# Altium schematic symbol library IC_ADI.SCHLIB: 3169 symbols (part 97 of 181)
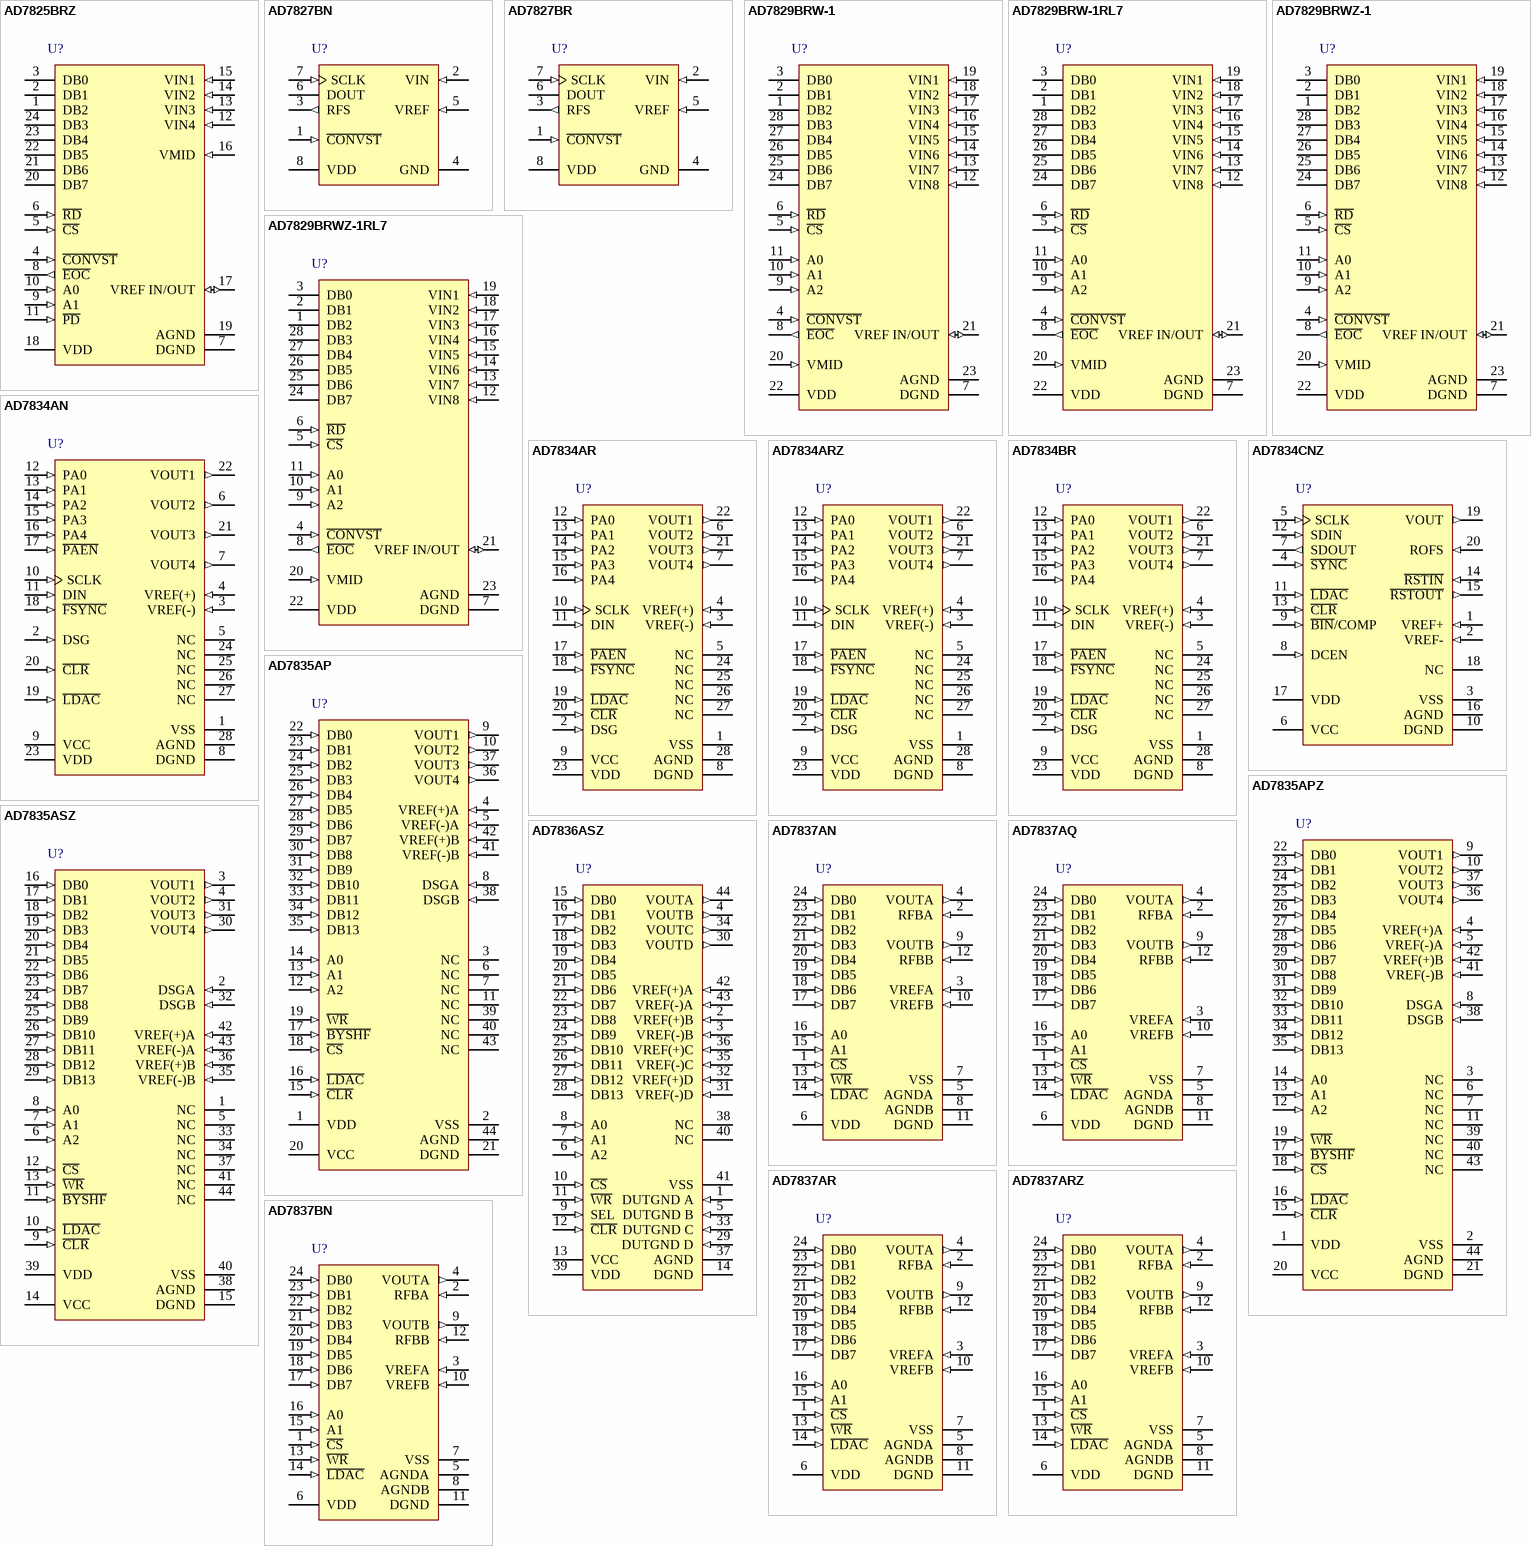
[diagram p287: symbols AD7825BRZ to AD7837BN]

## AD7829BRWZ-1
designator U?
Octal 8-Bit Analog-to-Digital Converter with Parallel Interface,3 V, 2MSPS, -40 to +85 degC, RW-28, Pb-Free, Tube; Generic Part Number: AD7829-1; PartNumber: AD7829BRWZ-1; Resolution (Bits): 8; Throughput Rate (SPS): 2M; Interface: Par; DatasheetVersion: Rev.0; PackageVersion: 060706-A; PackageReference: RW-28; PackageDescription: 28-Lead Standard Small Outline Package [SOIC_W]; Supplier Part Number 1: AD7829BRWZ-1-ND; Supplier Part Number 2: 1498673; Supplier Part Number 3: 28M4074; Supplier Part Number 4: 584-AD7829BRWZ-1; Channels: 8; RoHS: Y; Packing: Tube; Mounting Technology: Surface Mount; Code_JEDEC: MS-013-AE; ComponentLink1Description: Manufacturer URL; ComponentLink2Description: Datasheet; ComponentLink3Description: Package Specification; ComponentLink4Description: Product URL
footprint SOIC28W_1.27 (Footprint not found)
pins: 1 DB2 (hiz) "Data Output Lines. They are normally held in a high impedance state. Data is driven onto the data bus when both R\D\ and C\S\ go active low.", 2 DB1 (hiz) "Data Output Lines. They are normally held in a high impedance state. Data is driven onto the data bus when both R\D\ and C\S\ go active low.", 3 DB0 (hiz) "Data Output Lines. They are normally held in a high impedance state. Data is driven onto the data bus when both R\D\ and C\S\ go active low.", 4 ~{CONVST} (in) "Logic Input Signal. The convert start signal initiates an 8-bit analog-to-digital conversion on the falling edge of this signal. The falling edge of this signal places the track/hold in hold mode. The track/hold goes into (See Datasheet)", 5 ~{CS} (in) "Logic Input Signal. The chip select signal is used to enable the parallel port of the AD7829. This is necessary if the ADC is sharing a common data bus with another device.", 6 ~{RD} (in) "Logic Input Signal. The read signal is used to take the output buffers out of their high impedance state and drive data onto the data bus. The signal is internally gated with the CS signal. Both R\D\ and C\S\ must be logic (See Datasheet)", 7 DGND (power) "Digital Ground. Ground reference for digital circuitry.", 8 ~{EOC} (out) "Logic Output. The end of conversion signal indicates when a conversion has finished. The signal can be used to interrupt a microcontroller when a conversion has finished or latch data into a gate array (see the Parallel (See Datasheet)", 9 A2 (in) "Channel Address Inputs. The address of the next multiplexer channel must be present on these inputs when the R\D\ signal goes low.", 10 A1 (in) "Channel Address Inputs. The address of the next multiplexer channel must be present on these inputs when the R\D\ signal goes low.", 11 A0 (in) "Channel Address Inputs. The address of the next multiplexer channel must be present on these inputs when the R\D\ signal goes low.", 12 VIN8 (in) "Analog Input Channels. The AD7829-1 has eight analog input channels. The inputs have an input span of 2.5 V and 2 V, depending on the supply voltage (VDD). This span can be centered anywhere in the range AGND to VDD using (See Datasheet)", 13 VIN7 (in) "Analog Input Channels. The AD7829-1 has eight analog input channels. The inputs have an input span of 2.5 V and 2 V, depending on the supply voltage (VDD). This span can be centered anywhere in the range AGND to VDD using (See Datasheet)", 14 VIN6 (in) "Analog Input Channels. The AD7829-1 has eight analog input channels. The inputs have an input span of 2.5 V and 2 V, depending on the supply voltage (VDD). This span can be centered anywhere in the range AGND to VDD using (See Datasheet)", 15 VIN5 (in) "Analog Input Channels. The AD7829-1 has eight analog input channels. The inputs have an input span of 2.5 V and 2 V, depending on the supply voltage (VDD). This span can be centered anywhere in the range AGND to VDD using (See Datasheet)", 16 VIN4 (in) "Analog Input Channels. The AD7829-1 has eight analog input channels. The inputs have an input span of 2.5 V and 2 V, depending on the supply voltage (VDD). This span can be centered anywhere in the range AGND to VDD using (See Datasheet)", 17 VIN3 (in) "Analog Input Channels. The AD7829-1 has eight analog input channels. The inputs have an input span of 2.5 V and 2 V, depending on the supply voltage (VDD). This span can be centered anywhere in the range AGND to VDD using (See Datasheet)", 18 VIN2 (in) "Analog Input Channels. The AD7829-1 has eight analog input channels. The inputs have an input span of 2.5 V and 2 V, depending on the supply voltage (VDD). This span can be centered anywhere in the range AGND to VDD using (See Datasheet)", 19 VIN1 (in) "Analog Input Channels. The AD7829-1 has eight analog input channels. The inputs have an input span of 2.5 V and 2 V, depending on the supply voltage (VDD). This span can be centered anywhere in the range AGND to VDD using (See Datasheet)", 20 VMID (in) "The VMID pin, if connected, is used to center the analog input span anywhere in the range of AGND to VDD (see the Analog Input section).", 21 VREF IN/OUT (io) "Analog Input and Output. An external reference can be connected to the AD7829-1 at this pin. The on-chip reference is also available at this pin. When using the internal reference, this pin can be left unconnected or, in (See Datasheet)", 22 VDD (power) "Positive Supply Voltage, 3 V +/- 10% and 5 V +/- 10%.", 23 AGND (power) "Analog Ground. Ground reference for track/hold, comparators, reference circuit, and multiplexer.", 24 DB7 (hiz) "Data Output Lines. They are normally held in a high impedance state. Data is driven onto the data bus when both R\D\ and C\S\ go active low.", 25 DB6 (hiz) "Data Output Lines. They are normally held in a high impedance state. Data is driven onto the data bus when both R\D\ and C\S\ go active low.", 26 DB5 (hiz) "Data Output Lines. They are normally held in a high impedance state. Data is driven onto the data bus when both R\D\ and C\S\ go active low.", 27 DB4 (hiz) "Data Output Lines. They are normally held in a high impedance state. Data is driven onto the data bus when both R\D\ and C\S\ go active low.", 28 DB3 (hiz) "Data Output Lines. They are normally held in a high impedance state. Data is driven onto the data bus when both R\D\ and C\S\ go active low."

## AD7829BRWZ-1RL7
designator U?
Octal 8-Bit Analog-to-Digital Converter with Parallel Interface,3 V, 2MSPS, -40 to +85 degC, RW-28, Pb-Free, Reel; Generic Part Number: AD7829-1; PartNumber: AD7829BRWZ-1RL7; Resolution (Bits): 8; Throughput Rate (SPS): 2M; Interface: Par; DatasheetVersion: Rev.0; PackageVersion: 060706-A; PackageReference: RW-28; PackageDescription: 28-Lead Standard Small Outline Package [SOIC_W]; Supplier Part Number 1: AD7829BRWZ-1RL7-ND; Supplier Part Number 2: 584-AD7829BRWZ-1R7; Channels: 8; RoHS: Y; Packing: Reel; Mounting Technology: Surface Mount; Code_JEDEC: MS-013-AE; ComponentLink1Description: Manufacturer URL; ComponentLink2Description: Datasheet; ComponentLink3Description: Package Specification; ComponentLink4Description: Product URL
footprint SOIC28W_1.27 (Footprint not found)
pins: 1 DB2 (hiz) "Data Output Lines. They are normally held in a high impedance state. Data is driven onto the data bus when both R\D\ and C\S\ go active low.", 2 DB1 (hiz) "Data Output Lines. They are normally held in a high impedance state. Data is driven onto the data bus when both R\D\ and C\S\ go active low.", 3 DB0 (hiz) "Data Output Lines. They are normally held in a high impedance state. Data is driven onto the data bus when both R\D\ and C\S\ go active low.", 4 ~{CONVST} (in) "Logic Input Signal. The convert start signal initiates an 8-bit analog-to-digital conversion on the falling edge of this signal. The falling edge of this signal places the track/hold in hold mode. The track/hold goes into (See Datasheet)", 5 ~{CS} (in) "Logic Input Signal. The chip select signal is used to enable the parallel port of the AD7829. This is necessary if the ADC is sharing a common data bus with another device.", 6 ~{RD} (in) "Logic Input Signal. The read signal is used to take the output buffers out of their high impedance state and drive data onto the data bus. The signal is internally gated with the CS signal. Both R\D\ and C\S\ must be logic (See Datasheet)", 7 DGND (power) "Digital Ground. Ground reference for digital circuitry.", 8 ~{EOC} (out) "Logic Output. The end of conversion signal indicates when a conversion has finished. The signal can be used to interrupt a microcontroller when a conversion has finished or latch data into a gate array (see the Parallel (See Datasheet)", 9 A2 (in) "Channel Address Inputs. The address of the next multiplexer channel must be present on these inputs when the R\D\ signal goes low.", 10 A1 (in) "Channel Address Inputs. The address of the next multiplexer channel must be present on these inputs when the R\D\ signal goes low.", 11 A0 (in) "Channel Address Inputs. The address of the next multiplexer channel must be present on these inputs when the R\D\ signal goes low.", 12 VIN8 (in) "Analog Input Channels. The AD7829-1 has eight analog input channels. The inputs have an input span of 2.5 V and 2 V, depending on the supply voltage (VDD). This span can be centered anywhere in the range AGND to VDD using (See Datasheet)", 13 VIN7 (in) "Analog Input Channels. The AD7829-1 has eight analog input channels. The inputs have an input span of 2.5 V and 2 V, depending on the supply voltage (VDD). This span can be centered anywhere in the range AGND to VDD using (See Datasheet)", 14 VIN6 (in) "Analog Input Channels. The AD7829-1 has eight analog input channels. The inputs have an input span of 2.5 V and 2 V, depending on the supply voltage (VDD). This span can be centered anywhere in the range AGND to VDD using (See Datasheet)", 15 VIN5 (in) "Analog Input Channels. The AD7829-1 has eight analog input channels. The inputs have an input span of 2.5 V and 2 V, depending on the supply voltage (VDD). This span can be centered anywhere in the range AGND to VDD using (See Datasheet)", 16 VIN4 (in) "Analog Input Channels. The AD7829-1 has eight analog input channels. The inputs have an input span of 2.5 V and 2 V, depending on the supply voltage (VDD). This span can be centered anywhere in the range AGND to VDD using (See Datasheet)", 17 VIN3 (in) "Analog Input Channels. The AD7829-1 has eight analog input channels. The inputs have an input span of 2.5 V and 2 V, depending on the supply voltage (VDD). This span can be centered anywhere in the range AGND to VDD using (See Datasheet)", 18 VIN2 (in) "Analog Input Channels. The AD7829-1 has eight analog input channels. The inputs have an input span of 2.5 V and 2 V, depending on the supply voltage (VDD). This span can be centered anywhere in the range AGND to VDD using (See Datasheet)", 19 VIN1 (in) "Analog Input Channels. The AD7829-1 has eight analog input channels. The inputs have an input span of 2.5 V and 2 V, depending on the supply voltage (VDD). This span can be centered anywhere in the range AGND to VDD using (See Datasheet)", 20 VMID (in) "The VMID pin, if connected, is used to center the analog input span anywhere in the range of AGND to VDD (see the Analog Input section).", 21 VREF IN/OUT (io) "Analog Input and Output. An external reference can be connected to the AD7829-1 at this pin. The on-chip reference is also available at this pin. When using the internal reference, this pin can be left unconnected or, in (See Datasheet)", 22 VDD (power) "Positive Supply Voltage, 3 V +/- 10% and 5 V +/- 10%.", 23 AGND (power) "Analog Ground. Ground reference for track/hold, comparators, reference circuit, and multiplexer.", 24 DB7 (hiz) "Data Output Lines. They are normally held in a high impedance state. Data is driven onto the data bus when both R\D\ and C\S\ go active low.", 25 DB6 (hiz) "Data Output Lines. They are normally held in a high impedance state. Data is driven onto the data bus when both R\D\ and C\S\ go active low.", 26 DB5 (hiz) "Data Output Lines. They are normally held in a high impedance state. Data is driven onto the data bus when both R\D\ and C\S\ go active low.", 27 DB4 (hiz) "Data Output Lines. They are normally held in a high impedance state. Data is driven onto the data bus when both R\D\ and C\S\ go active low.", 28 DB3 (hiz) "Data Output Lines. They are normally held in a high impedance state. Data is driven onto the data bus when both R\D\ and C\S\ go active low."

## AD7834AN
designator U?
Quad 14-Bit LC2MOS Digital-to-Analog Converter, -40 to +85 degC, N-28-2, Tube; Generic Part Number: AD7834; PartNumber: AD7834AN; # DAC Outputs: 4; Max V+: 15.75V; Op Pwr Diss: 465mW; Resolution (Bits): 14; Settling Time: 10祍; Single Supply: No; DatasheetVersion: Rev.D; PackageVersion: 071006-A; PackageReference: N-28-2; PackageDescription: 28-Lead Plastic Dual In-Line Package [PDIP]; Supplier Part Number 1: AD7834AN-ND; Supplier Part Number 2: 584-AD7834AN; Packing: Tube; RoHS: N; Mounting Technology: Through Hole; Code_JEDEC: MS-011; ComponentLink1Description: Manufacturer URL; ComponentLink2Description: Datasheet; ComponentLink3Description: Package Specification; ComponentLink4Description: Product URL
footprint DIP28W
pins: 1 VSS (power) "Negative Analog Power Supply: -15 V +/- 5% or -12 V +/- 5%.", 2 DSG (in) "Device Sense Ground Input. Used in conjunction with the C\L\R\ input for power-on protection of  the DACs. When C\L\R\ is low, the DAC outputs are forced to the potential on the DSG pin.", 3 VREF(-) (in) "Negative Reference Input. The negative reference voltage is referred to AGND.", 4 VREF(+) (in) "Positive Reference Input. The positive reference voltage is referred to AGND.", 5 NC "No Connect.", 6 VOUT2 (out) "DAC Output.", 7 VOUT4 (out) "DAC Output.", 8 DGND (power) "Digital Ground.", 9 VCC (power) "Logic Power Supply: 5 V +/- 5%.", 10 SCLK (in) "Clock Input. Used for writing data to the device; data is clocked into the input register on the falling edge of SCLK.", 11 DIN (in) "Serial Data Input.", 12 PA0 (in) "Package Address Input. These inputs are hardwired high (VCC) or low (DGND) to assign dedicated package addresses in a multipackage environment.", 13 PA1 (in) "Package Address Input. These inputs are hardwired high (VCC) or low (DGND) to assign dedicated package addresses in a multipackage environment.", 14 PA2 (in) "Package Address Input. These inputs are hardwired high (VCC) or low (DGND) to assign dedicated package addresses in a multipackage environment.", 15 PA3 (in) "Package Address Input. These inputs are hardwired high (VCC) or low (DGND) to assign dedicated package addresses in a multipackage environment.", 16 PA4 (in) "Package Address Input. These inputs are hardwired high (VCC) or low (DGND) to assign dedicated package addresses in a multipackage environment.", 17 ~{PAEN} (in) "Package Address Enable Input. When low, this input allows normal operation of the device. When high, the device ignores the package address, but not the channel address, in the serial data stream and loads the serial data (See Datasheet)", 18 ~{FSYNC} (in) "Frame Sync Input. Active low logic input used, in conjunction with DIN and SCLK, to write data to the device with serial data expected after the falling edge of this signal. The contents of the 24-bit serial-to-parallel (See Datasheet)", 19 ~{LDAC} (in) "Load DAC Input (Level Sensitive). This input signal, in conjunction with the F\S\Y\N\C\ input signal, determines how the analog outputs are updated. If L\D\A\C\ is maintained high while new data is being loaded into the (See Datasheet)", 20 ~{CLR} (in) "Asynchronous Clear Input (Level Sensitive, Active Low). When this input is brought low, all analog outputs are switched to the externally set potential on the DSG pin. When C\L\R\ is brought high, the signal outputs remain (See Datasheet)", 21 VOUT3 (out) "DAC Output.", 22 VOUT1 (out) "DAC Output.", 23 VDD (power) "Positive Analog Power Supply: 15 V +/-5% or 12 V +/- 5%.", 24 NC "No Connect.", 25 NC "No Connect.", 26 NC "No Connect.", 27 NC "No Connect.", 28 AGND (power) "Analog Ground."

## AD7834AR
designator U?
Quad 14-Bit LC2MOS Digital-to-Analog Converter, -40 to +85 degC, RW-28, Tube; Generic Part Number: AD7834; PartNumber: AD7834AR; # DAC Outputs: 4; Max V+: 15.75V; Op Pwr Diss: 465mW; Resolution (Bits): 14; Settling Time: 10祍; Single Supply: No; DatasheetVersion: Rev.D; PackageVersion: 060706-A; PackageReference: RW-28; PackageDescription: 28-Lead Standard Small Outline Package [SOIC_W]; Supplier Part Number 1: AD7834AR-ND; Supplier Part Number 2: 584-AD7834AR; Packing: Tube; RoHS: N; Mounting Technology: Surface Mount; Code_JEDEC: MS-013-AE; ComponentLink1Description: Manufacturer URL; ComponentLink2Description: Datasheet; ComponentLink3Description: Product URL
footprint SOIC28W_1.27 (Footprint not found)
pins: 1 VSS (power) "Negative Analog Power Supply: -15 V +/- 5% or -12 V +/- 5%.", 2 DSG (in) "Device Sense Ground Input. Used in conjunction with the C\L\R\ input for power-on protection of  the DACs. When C\L\R\ is low, the DAC outputs are forced to the potential on the DSG pin.", 3 VREF(-) (in) "Negative Reference Input. The negative reference voltage is referred to AGND.", 4 VREF(+) (in) "Positive Reference Input. The positive reference voltage is referred to AGND.", 5 NC "No Connect.", 6 VOUT2 (out) "DAC Output.", 7 VOUT4 (out) "DAC Output.", 8 DGND (power) "Digital Ground.", 9 VCC (power) "Logic Power Supply: 5 V +/- 5%.", 10 SCLK (in) "Clock Input. Used for writing data to the device; data is clocked into the input register on the falling edge of SCLK.", 11 DIN (in) "Serial Data Input.", 12 PA0 (in) "Package Address Input. These inputs are hardwired high (VCC) or low (DGND) to assign dedicated package addresses in a multipackage environment.", 13 PA1 (in) "Package Address Input. These inputs are hardwired high (VCC) or low (DGND) to assign dedicated package addresses in a multipackage environment.", 14 PA2 (in) "Package Address Input. These inputs are hardwired high (VCC) or low (DGND) to assign dedicated package addresses in a multipackage environment.", 15 PA3 (in) "Package Address Input. These inputs are hardwired high (VCC) or low (DGND) to assign dedicated package addresses in a multipackage environment.", 16 PA4 (in) "Package Address Input. These inputs are hardwired high (VCC) or low (DGND) to assign dedicated package addresses in a multipackage environment.", 17 ~{PAEN} (in) "Package Address Enable Input. When low, this input allows normal operation of the device. When high, the device ignores the package address, but not the channel address, in the serial data stream and loads the serial data (See Datasheet)", 18 ~{FSYNC} (in) "Frame Sync Input. Active low logic input used, in conjunction with DIN and SCLK, to write data to the device with serial data expected after the falling edge of this signal. The contents of the 24-bit serial-to-parallel (See Datasheet)", 19 ~{LDAC} (in) "Load DAC Input (Level Sensitive). This input signal, in conjunction with the F\S\Y\N\C\ input signal, determines how the analog outputs are updated. If L\D\A\C\ is maintained high while new data is being loaded into the (See Datasheet)", 20 ~{CLR} (in) "Asynchronous Clear Input (Level Sensitive, Active Low). When this input is brought low, all analog outputs are switched to the externally set potential on the DSG pin. When C\L\R\ is brought high, the signal outputs remain (See Datasheet)", 21 VOUT3 (out) "DAC Output.", 22 VOUT1 (out) "DAC Output.", 23 VDD (power) "Positive Analog Power Supply: 15 V +/- 5% or 12 V +/- 5%.", 24 NC "No Connect.", 25 NC "No Connect.", 26 NC "No Connect.", 27 NC "No Connect.", 28 AGND (power) "Analog Ground."

## AD7834ARZ
designator U?
Quad 14-Bit LC2MOS Digital-to-Analog Converter, -40 to +85 degC, RW-28, Pb-Free, Tube; Generic Part Number: AD7834; PartNumber: AD7834ARZ; # DAC Outputs: 4; Max V+: 15.75V; Op Pwr Diss: 465mW; Resolution (Bits): 14; Settling Time: 10祍; Single Supply: No; DatasheetVersion: Rev.D; PackageVersion: 060706-A; PackageReference: RW-28; PackageDescription: 28-Lead Standard Small Outline Package [SOIC_W]; Supplier Part Number 1: AD7834ARZ-ND; Supplier Part Number 2: 584-AD7834ARZ; Packing: Tube; RoHS: Y; Mounting Technology: Surface Mount; Code_JEDEC: MS-013-AE; ComponentLink1Description: Manufacturer URL; ComponentLink2Description: Datasheet; ComponentLink3Description: Product URL
footprint SOIC28W_1.27 (Footprint not found)
pins: 1 VSS (power) "Negative Analog Power Supply: -15 V +/- 5% or -12 V +/- 5%.", 2 DSG (in) "Device Sense Ground Input. Used in conjunction with the C\L\R\ input for power-on protection of  the DACs. When C\L\R\ is low, the DAC outputs are forced to the potential on the DSG pin.", 3 VREF(-) (in) "Negative Reference Input. The negative reference voltage is referred to AGND.", 4 VREF(+) (in) "Positive Reference Input. The positive reference voltage is referred to AGND.", 5 NC "No Connect.", 6 VOUT2 (out) "DAC Output.", 7 VOUT4 (out) "DAC Output.", 8 DGND (power) "Digital Ground.", 9 VCC (power) "Logic Power Supply: 5 V +/- 5%.", 10 SCLK (in) "Clock Input. Used for writing data to the device; data is clocked into the input register on the falling edge of SCLK.", 11 DIN (in) "Serial Data Input.", 12 PA0 (in) "Package Address Input. These inputs are hardwired high (VCC) or low (DGND) to assign dedicated package addresses in a multipackage environment.", 13 PA1 (in) "Package Address Input. These inputs are hardwired high (VCC) or low (DGND) to assign dedicated package addresses in a multipackage environment.", 14 PA2 (in) "Package Address Input. These inputs are hardwired high (VCC) or low (DGND) to assign dedicated package addresses in a multipackage environment.", 15 PA3 (in) "Package Address Input. These inputs are hardwired high (VCC) or low (DGND) to assign dedicated package addresses in a multipackage environment.", 16 PA4 (in) "Package Address Input. These inputs are hardwired high (VCC) or low (DGND) to assign dedicated package addresses in a multipackage environment.", 17 ~{PAEN} (in) "Package Address Enable Input. When low, this input allows normal operation of the device. When high, the device ignores the package address, but not the channel address, in the serial data stream and loads the serial data (See Datasheet)", 18 ~{FSYNC} (in) "Frame Sync Input. Active low logic input used, in conjunction with DIN and SCLK, to write data to the device with serial data expected after the falling edge of this signal. The contents of the 24-bit serial-to-parallel (See Datasheet)", 19 ~{LDAC} (in) "Load DAC Input (Level Sensitive). This input signal, in conjunction with the F\S\Y\N\C\ input signal, determines how the analog outputs are updated. If L\D\A\C\ is maintained high while new data is being loaded into the (See Datasheet)", 20 ~{CLR} (in) "Asynchronous Clear Input (Level Sensitive, Active Low). When this input is brought low, all analog outputs are switched to the externally set potential on the DSG pin. When C\L\R\ is brought high, the signal outputs remain (See Datasheet)", 21 VOUT3 (out) "DAC Output.", 22 VOUT1 (out) "DAC Output.", 23 VDD (power) "Positive Analog Power Supply: 15 V +/- 5% or 12 V +/- 5%.", 24 NC "No Connect.", 25 NC "No Connect.", 26 NC "No Connect.", 27 NC "No Connect.", 28 AGND (power) "Analog Ground."

## AD7834BR
designator U?
Quad 14-Bit LC2MOS Digital-to-Analog Converter, -40 to +85 degC, RW-28, Tube; Generic Part Number: AD7834; PartNumber: AD7834BR; # DAC Outputs: 4; Max V+: 15.75V; Op Pwr Diss: 465mW; Resolution (Bits): 14; Settling Time: 10祍; Single Supply: No; DatasheetVersion: Rev.D; PackageVersion: 060706-A; PackageReference: RW-28; PackageDescription: 28-Lead Standard Small Outline Package [SOIC_W]; Supplier Part Number 1: AD7834BR-ND; Supplier Part Number 2: 584-AD7834BR; Packing: Tube; RoHS: N; Mounting Technology: Surface Mount; Code_JEDEC: MS-013-AE; ComponentLink1Description: Manufacturer URL; ComponentLink2Description: Datasheet; ComponentLink3Description: Product URL
footprint SOIC28W_1.27 (Footprint not found)
pins: 1 VSS (power) "Negative Analog Power Supply: -15 V +/- 5% or -12 V +/- 5%.", 2 DSG (in) "Device Sense Ground Input. Used in conjunction with the C\L\R\ input for power-on protection of  the DACs. When C\L\R\ is low, the DAC outputs are forced to the potential on the DSG pin.", 3 VREF(-) (in) "Negative Reference Input. The negative reference voltage is referred to AGND.", 4 VREF(+) (in) "Positive Reference Input. The positive reference voltage is referred to AGND.", 5 NC "No Connect.", 6 VOUT2 (out) "DAC Output.", 7 VOUT4 (out) "DAC Output.", 8 DGND (power) "Digital Ground.", 9 VCC (power) "Logic Power Supply: 5 V +/- 5%.", 10 SCLK (in) "Clock Input. Used for writing data to the device; data is clocked into the input register on the falling edge of SCLK.", 11 DIN (in) "Serial Data Input.", 12 PA0 (in) "Package Address Input. These inputs are hardwired high (VCC) or low (DGND) to assign dedicated package addresses in a multipackage environment.", 13 PA1 (in) "Package Address Input. These inputs are hardwired high (VCC) or low (DGND) to assign dedicated package addresses in a multipackage environment.", 14 PA2 (in) "Package Address Input. These inputs are hardwired high (VCC) or low (DGND) to assign dedicated package addresses in a multipackage environment.", 15 PA3 (in) "Package Address Input. These inputs are hardwired high (VCC) or low (DGND) to assign dedicated package addresses in a multipackage environment.", 16 PA4 (in) "Package Address Input. These inputs are hardwired high (VCC) or low (DGND) to assign dedicated package addresses in a multipackage environment.", 17 ~{PAEN} (in) "Package Address Enable Input. When low, this input allows normal operation of the device. When high, the device ignores the package address, but not the channel address, in the serial data stream and loads the serial data (See Datasheet)", 18 ~{FSYNC} (in) "Frame Sync Input. Active low logic input used, in conjunction with DIN and SCLK, to write data to the device with serial data expected after the falling edge of this signal. The contents of the 24-bit serial-to-parallel (See Datasheet)", 19 ~{LDAC} (in) "Load DAC Input (Level Sensitive). This input signal, in conjunction with the F\S\Y\N\C\ input signal, determines how the analog outputs are updated. If L\D\A\C\ is maintained high while new data is being loaded into the (See Datasheet)", 20 ~{CLR} (in) "Asynchronous Clear Input (Level Sensitive, Active Low). When this input is brought low, all analog outputs are switched to the externally set potential on the DSG pin. When C\L\R\ is brought high, the signal outputs remain (See Datasheet)", 21 VOUT3 (out) "DAC Output.", 22 VOUT1 (out) "DAC Output.", 23 VDD (power) "Positive Analog Power Supply: 15 V +/- 5% or 12 V +/- 5%.", 24 NC "No Connect.", 25 NC "No Connect.", 26 NC "No Connect.", 27 NC "No Connect.", 28 AGND (power) "Analog Ground."

## AD7834CNZ
designator U?
Single 16-Bit Digital-to-Analog Converter with Serial Interface, -40 to +85 degC, N-20, Pb-Free, Tube; Generic Part Number: AD7849; PartNumber: AD7834CNZ; # DAC Outputs: 1; Max V+: 15.75V; Op Pwr Diss: 163mW; Resolution (Bits): 16; Settling Time: 7祍; Single Supply: No; DatasheetVersion: Rev.C; PackageVersion: 070706-A; PackageReference: N-20; PackageDescription: 20-Lead Plastic Dual In-Line Package [PDIP] Narrow Body; Supplier Part Number 1: N/A; Packing: Tube; RoHS: Y; Mounting Technology: Through Hole; Code_JEDEC: MS-001; ComponentLink1Description: Manufacturer URL; ComponentLink2Description: Datasheet; ComponentLink3Description: Package Specification; ComponentLink4Description: Product URL
footprint DIP20 (Footprint not found)
pins: 1 VREF+ (in) "VREF+ Input. The DAC is specified for VREF+ of 5 V. The DAC is fully multiplying so that the VREF+ range is +5 V to -5 V.", 2 VREF- (in) "VREF? Input. The DAC is specified for VREF- of -5 V. The DAC is fully multiplying so that the VREF- range is -5 V to +5 V.", 3 VSS (power) "Negative supply for the analog circuitry. This is nominally -15 V.", 4 ~{SYNC} (in) "Data Synchronization Logic Input. When it goes low, the internal logic is initialized in readiness for a new data-word.", 5 SCLK (in) "Serial Clock Logic Input. Data is clocked into the input register on each SCLK falling edge.", 6 VCC (power) "Positive supply for the digital circuitry. This is nominally 5 V.", 7 SDOUT (out) "Serial Data Output. With DCEN at Logic 1, this output is enabled, and the serial data in the input shift register is clocked out on each rising edge of SCLK.", 8 DCEN (in) "Daisy-Chain Enable Logic Input. Connect this pin high if a daisy-chain interface is being used; otherwise, this pin must be connected low.", 9 ~{BIN}/COMP (in) "Logic Input. This input selects the data format to be either binary or twos complement. In the unipolar output range, natural binary format is selected by connecting the input to Logic 0. In the bipolar output range, offset (See Datasheet)", 10 DGND (power) "Digital Ground. Ground reference point for the on-chip digital circuitry.", 11 ~{LDAC} (in) "Load DAC Logic Input. This input updates the DAC output. The DAC output is updated on the falling edge of this signal, or alternatively, if this input is permanently low, an automatic update mode is selected where the DAC is (See Datasheet)", 12 SDIN (in) "Serial Data Input. The 16-bit serial data-word is applied to this input.", 13 ~{CLR} (in) "Clear Logic Input. Taking this input low sets VOUT to 0 V in both the unipolar output range and the bipolar twos complement output range. It sets VOUT to VREF- in the offset binary bipolar output range.", 14 ~{RSTIN} (in) "Reset Logic Input. This input allows external access to the internal reset logic. Applying Logic 0 to this input,resets the DAC output to 0 V. In normal operation, it should be tied to Logic 1.", 15 ~{RSTOUT} (out) "Reset Logic Output. This is the output from the on-chip voltage monitor used in the reset circuit. It can be used to control other system components, if desired", 16 AGND (power) "This is the analog ground for the device. It is the point to which the output gets shorted in reset mode.", 17 VDD (power) "Positive Supply for the Analog Circuitry. This is 15 V nominal.", 18 NC "No Connect. Leave unconnected.", 19 VOUT (out) "DAC Output Voltage Pin.", 20 ROFS (in) "Input to Summing Resistor of DAC Output Amplifier. This is used to select the output voltage ranges. Also, see Figure 20 to Figure 23 in the Applying the AD7849 section."

## AD7835AP
designator U?
Quad 14-Bit LC2MOS Digital-to-Analog Converter, -40 to +85 degC, P-44A, Tube; Generic Part Number: AD7835; PartNumber: AD7835AP; # DAC Outputs: 4; Max V+: 15.75V; Op Pwr Diss: 465mW; Resolution (Bits): 14; Settling Time: 10祍; Single Supply: No; DatasheetVersion: Rev.D; PackageVersion: 2003; PackageReference: P-44A; PackageDescription: 44-Lead Plastic Leaded Chip Carrier [PLCC]; Supplier Part Number 1: AD7835AP-ND; Supplier Part Number 2: 584-AD7835AP; Packing: Tube; RoHS: N; Mounting Technology: Surface Mount; Code_JEDEC: MO-047-AC; Code_IPC: PLCC-44; ComponentLink1Description: Manufacturer URL; ComponentLink2Description: Datasheet; ComponentLink3Description: Package Specification; ComponentLink4Description: Product URL
footprint PLCC-44N (Footprint not found)
pins: 1 VDD (power) "Positive Analog Power Supply: 15 V +/- 5% or 12 V +/- 5%.", 2 VSS (power) "Negative Analog Power Supply: -15 V +/- 5% or -12 V +/- 5%.", 3 NC "No Connect.", 4 VREF(+)A (in) "Reference Input for DAC 1 and DAC 2. These reference voltages are referred to AGND.", 5 VREF(-)A (in) "Reference Input for DAC 1 and DAC 2. These reference voltages are referred to AGND.", 6 NC "No Connect.", 7 NC "No Connect.", 8 DSGA (in) "Device Sense Ground A Input. Used in conjunction with the C\L\R\ input for power-on protection of the DACs. When C\L\R\ is low, DAC outputs VOUT1 and VOUT2 are forced to the potential on the DSGA pin.", 9 VOUT1 (out) "DAC Output.", 10 VOUT2 (out) "DAC Output.", 11 NC "No Connect.", 12 A2 (in) "Address Input. A0 and A1 are decoded to select one of the four input latches for a data transfer. A2 is used to select all four DACs simultaneously.", 13 A1 (in) "Address Input. A0 and A1 are decoded to select one of the four input latches for a data transfer. A2 is used to select all four DACs simultaneously.", 14 A0 (in) "Address Input. A0 and A1 are decoded to select one of the four input latches for a data transfer. A2 is used to select all four DACs simultaneously.", 15 ~{CLR} (in) "Asynchronous Clear Input (Level Sensitive, Active Low). When this input is brought low, all analog outputs are switched to the externally set potentials on the DSG pins (VOUT1 and VOUT2 follow DSGA, and VOUT3 and VOUT4 (See Datasheet)", 16 ~{LDAC} (in) "Load DAC Input (Level Sensitive). This input signal, in conjunction with the W\R\ and C\S\ input signals, determines how the analog outputs are updated. If L\D\A\C\ is maintained high while new data is being loaded into the (See Datasheet)", 17 ~{BYSHF} (in) "Byte Shift Input. When low, it shifts the data on DB0 to DB7 into the DB8 to DB13 half of the input register.", 18 ~{CS} (in) "Level-Triggered Chip Select Input (Active Low). The device is selected when this input is low.", 19 ~{WR} (in) "Level-Triggered Write Input (Active Low). When active, it is used in conjunction with C\S\ to write data over the input databus.", 20 VCC (power) "Logic Power Supply: 5 V +/- 5%.", 21 DGND (power) "Digital Ground.", 22 DB0 (in) "Parallel Data Input.", 23 DB1 (in) "Parallel Data Input.", 24 DB2 (in) "Parallel Data Input.", 25 DB3 (in) "Parallel Data Input.", 26 DB4 (in) "Parallel Data Input.", 27 DB5 (in) "Parallel Data Input.", 28 DB6 (in) "Parallel Data Input.", 29 DB7 (in) "Parallel Data Input.", 30 DB8 (in) "Parallel Data Input.", 31 DB9 (in) "Parallel Data Input.", 32 DB10 (in) "Parallel Data Input.", 33 DB11 (in) "Parallel Data Input.", 34 DB12 (in) "Parallel Data Input.", 35 DB13 (in) "Parallel Data Input.", 36 VOUT4 (out) "DAC Output.", 37 VOUT3 (out) "DAC Output.", 38 DSGB (in) "Device Sense Ground B Input. Used in conjunction with the C\L\R\ input for power-on protection of the DACs. When C\L\R\ is low, DAC outputs VOUT3 and VOUT4 are forced to the potential on the DSGB pin.", 39 NC "No Connect.", 40 NC "No Connect.", 41 VREF(-)B (in) "Reference Inputs for DACs 3 and 4. These reference voltages are referred to AGND.", 42 VREF(+)B (in) "Reference Inputs for DACs 3 and 4. These reference voltages are referred to AGND.", 43 NC "No Connect.", 44 AGND (power) "Analog Ground."

## AD7835APZ
designator U?
Quad 14-Bit LC2MOS Digital-to-Analog Converter, -40 to +85 degC, P-44A, Pb-Free, Tube; Generic Part Number: AD7835; PartNumber: AD7835APZ; # DAC Outputs: 4; Max V+: 15.75V; Op Pwr Diss: 465mW; Resolution (Bits): 14; Settling Time: 10祍; Single Supply: No; DatasheetVersion: Rev.D; PackageVersion: 2003; PackageReference: P-44A; PackageDescription: 44-Lead Plastic Leaded Chip Carrier [PLCC]; Supplier Part Number 1: AD7835APZ-ND; Supplier Part Number 2: 584-AD7835APZ; Packing: Tube; RoHS: Y; Mounting Technology: Surface Mount; Code_JEDEC: MO-047-AC; Code_IPC: PLCC-44; ComponentLink1Description: Manufacturer URL; ComponentLink2Description: Datasheet; ComponentLink3Description: Package Specification; ComponentLink4Description: Product URL
footprint PLCC-44N (Footprint not found)
pins: 1 VDD (power) "Positive Analog Power Supply: 15 V +/- 5% or 12 V +/- 5%.", 2 VSS (power) "Negative Analog Power Supply: -15 V +/- 5% or -12 V +/- 5%.", 3 NC "No Connect.", 4 VREF(+)A (in) "Reference Input for DAC 1 and DAC 2. These reference voltages are referred to AGND.", 5 VREF(-)A (in) "Reference Input for DAC 1 and DAC 2. These reference voltages are referred to AGND.", 6 NC "No Connect.", 7 NC "No Connect.", 8 DSGA (in) "Device Sense Ground A Input. Used in conjunction with the C\L\R\ input for power-on protection of the DACs. When C\L\R\ is low, DAC outputs VOUT1 and VOUT2 are forced to the potential on the DSGA pin.", 9 VOUT1 (out) "DAC Output.", 10 VOUT2 (out) "DAC Output.", 11 NC "No Connect.", 12 A2 (in) "Address Input. A0 and A1 are decoded to select one of the four input latches for a data transfer. A2 is used to select all four DACs simultaneously.", 13 A1 (in) "Address Input. A0 and A1 are decoded to select one of the four input latches for a data transfer. A2 is used to select all four DACs simultaneously.", 14 A0 (in) "Address Input. A0 and A1 are decoded to select one of the four input latches for a data transfer. A2 is used to select all four DACs simultaneously.", 15 ~{CLR} (in) "Asynchronous Clear Input (Level Sensitive, Active Low). When this input is brought low, all analog outputs are switched to the externally set potentials on the DSG pins (VOUT1 and VOUT2 follow DSGA, and VOUT3 and VOUT4 (See Datasheet)", 16 ~{LDAC} (in) "Load DAC Input (Level Sensitive). This input signal, in conjunction with the W\R\ and C\S\ input signals, determines how the analog outputs are updated. If L\D\A\C\ is maintained high while new data is being loaded into the (See Datasheet)", 17 ~{BYSHF} (in) "Byte Shift Input. When low, it shifts the data on DB0 to DB7 into the DB8 to DB13 half of the input register.", 18 ~{CS} (in) "Level-Triggered Chip Select Input (Active Low). The device is selected when this input is low.", 19 ~{WR} (in) "Level-Triggered Write Input (Active Low). When active, it is used in conjunction with C\S\ to write data over the input databus.", 20 VCC (power) "Logic Power Supply: 5 V +/- 5%.", 21 DGND (power) "Digital Ground.", 22 DB0 (in) "Parallel Data Input.", 23 DB1 (in) "Parallel Data Input.", 24 DB2 (in) "Parallel Data Input.", 25 DB3 (in) "Parallel Data Input.", 26 DB4 (in) "Parallel Data Input.", 27 DB5 (in) "Parallel Data Input.", 28 DB6 (in) "Parallel Data Input.", 29 DB7 (in) "Parallel Data Input.", 30 DB8 (in) "Parallel Data Input.", 31 DB9 (in) "Parallel Data Input.", 32 DB10 (in) "Parallel Data Input.", 33 DB11 (in) "Parallel Data Input.", 34 DB12 (in) "Parallel Data Input.", 35 DB13 (in) "Parallel Data Input.", 36 VOUT4 (out) "DAC Output.", 37 VOUT3 (out) "DAC Output.", 38 DSGB (in) "Device Sense Ground B Input. Used in conjunction with the C\L\R\ input for power-on protection of the DACs. When C\L\R\ is low, DAC outputs VOUT3 and VOUT4 are forced to the potential on the DSGB pin.", 39 NC "No Connect.", 40 NC "No Connect.", 41 VREF(-)B (in) "Reference Inputs for DACs 3 and 4. These reference voltages are referred to AGND.", 42 VREF(+)B (in) "Reference Inputs for DACs 3 and 4. These reference voltages are referred to AGND.", 43 NC "No Connect.", 44 AGND (power) "Analog Ground."

## AD7835ASZ
designator U?
Quad 14-Bit LC2MOS Digital-to-Analog Converter, 0 to +70 degC, S-44-2, Pb-Free, Tray; Generic Part Number: AD7835; PartNumber: AD7835ASZ; # DAC Outputs: 4; Max V+: 15.75V; Op Pwr Diss: 465mW; Resolution (Bits): 14; Settling Time: 10祍; Single Supply: No; DatasheetVersion: Rev.D; PackageVersion: 041807-A; PackageReference: S-44-2; PackageDescription: 44-Lead Metric Quad Flat Package [MQFP]; Supplier Part Number 1: AD7835ASZ-ND; Supplier Part Number 2: 59K5624; Supplier Part Number 3: 584-AD7835ASZ; Packing: Tray; RoHS: Y; Mounting Technology: Surface Mount; Code_JEDEC: MO-122-AA-1; ComponentLink1Description: Manufacturer URL; ComponentLink2Description: Datasheet; ComponentLink3Description: Package Specification; ComponentLink4Description: Product URL
footprint LQFP44_0.8mm (Footprint not found)
pins: 1 NC "No Connect.", 2 DSGA (in) "Device Sense Ground A Input. Used in conjunction with the C\L\R\ input for power-on protection of the DACs. When C\L\R\ is low, DAC outputs VOUT1 and VOUT2 are forced to the potential on the DSGA pin.", 3 VOUT1 (out) "DAC Output.", 4 VOUT2 (out) "DAC Output.", 5 NC "No Connect.", 6 A2 (in) "Address Input. A2 is used to select all four DACs simultaneously.", 7 A1 (in) "Address Input. A1 is decoded to select one of the four input latches for a data transfer.", 8 A0 (in) "Address Input. A0 is decoded to select one of the four input latches for a data transfer.", 9 ~{CLR} (in) "Asynchronous Clear Input (Level Sensitive, Active Low). When this input is brought low, all analog outputs are switched to the externally set potentials on the DSG pins (VOUT1 and VOUT2 follow DSGA, and VOUT3 and VOUT4 (See Datasheet)", 10 ~{LDAC} (in) "Load DAC Input (Level Sensitive). This input signal, in conjunction with the W\R\ and C\S\ input signals, determines how the analog outputs are updated. If L\D\A\C\ is maintained high while new data is being loaded into the (See Datasheet)", 11 ~{BYSHF} (in) "Byte Shift Input. When low, it shifts the data on DB0 to DB7 into the DB8 to DB13 half of the input register.", 12 ~{CS} (in) "Level-Triggered Chip Select Input (Active Low). The device is selected when this input is low.", 13 ~{WR} (in) "Level-Triggered Write Input (Active Low). When active, it is used in conjunction with C\S\ to write data over the input databus.", 14 VCC (power) "Logic Power Supply: 5 V +/- 5%.", 15 DGND (power) "Digital Ground.", 16 DB0 (in) "Parallel Data Input. The AD7835 can accept a straight 14-bit parallel word on DB0 to DB13, where DB13 is the MSB and the B\Y\S\H\F\ input is hardwired to a logic high. Alternatively for byte loading, the bottom eight data (See Datasheet)", 17 DB1 (in) "Parallel Data Input. The AD7835 can accept a straight 14-bit parallel word on DB0 to DB13, where DB13 is the MSB and the B\Y\S\H\F\ input is hardwired to a logic high. Alternatively for byte loading, the bottom eight data (See Datasheet)", 18 DB2 (in) "Parallel Data Input. The AD7835 can accept a straight 14-bit parallel word on DB0 to DB13, where DB13 is the MSB and the B\Y\S\H\F\ input is hardwired to a logic high. Alternatively for byte loading, the bottom eight data (See Datasheet)", 19 DB3 (in) "Parallel Data Input. The AD7835 can accept a straight 14-bit parallel word on DB0 to DB13, where DB13 is the MSB and the B\Y\S\H\F\ input is hardwired to a logic high. Alternatively for byte loading, the bottom eight data (See Datasheet)", 20 DB4 (in) "Parallel Data Input. The AD7835 can accept a straight 14-bit parallel word on DB0 to DB13, where DB13 is the MSB and the B\Y\S\H\F\ input is hardwired to a logic high. Alternatively for byte loading, the bottom eight data (See Datasheet)", 21 DB5 (in) "Parallel Data Input. The AD7835 can accept a straight 14-bit parallel word on DB0 to DB13, where DB13 is the MSB and the B\Y\S\H\F\ input is hardwired to a logic high. Alternatively for byte loading, the bottom eight data (See Datasheet)", 22 DB6 (in) "Parallel Data Input. The AD7835 can accept a straight 14-bit parallel word on DB0 to DB13, where DB13 is the MSB and the B\Y\S\H\F\ input is hardwired to a logic high. Alternatively for byte loading, the bottom eight data (See Datasheet)", 23 DB7 (in) "Parallel Data Input. The AD7835 can accept a straight 14-bit parallel word on DB0 to DB13, where DB13 is the MSB and the B\Y\S\H\F\ input is hardwired to a logic high. Alternatively for byte loading, the bottom eight data (See Datasheet)", 24 DB8 (in) "Parallel Data Input. The AD7835 can accept a straight 14-bit parallel word on DB0 to DB13, where DB13 is the MSB and the B\Y\S\H\F\ input is hardwired to a logic high. Alternatively for byte loading, the bottom eight data (See Datasheet)", 25 DB9 (in) "Parallel Data Input. The AD7835 can accept a straight 14-bit parallel word on DB0 to DB13, where DB13 is the MSB and the B\Y\S\H\F\ input is hardwired to a logic high. Alternatively for byte loading, the bottom eight data (See Datasheet)", 26 DB10 (in) "Parallel Data Input. The AD7835 can accept a straight 14-bit parallel word on DB0 to DB13, where DB13 is the MSB and the B\Y\S\H\F\ input is hardwired to a logic high. Alternatively for byte loading, the bottom eight data (See Datasheet)", 27 DB11 (in) "Parallel Data Input. The AD7835 can accept a straight 14-bit parallel word on DB0 to DB13, where DB13 is the MSB and the B\Y\S\H\F\ input is hardwired to a logic high. Alternatively for byte loading, the bottom eight data (See Datasheet)", 28 DB12 (in) "Parallel Data Input. The AD7835 can accept a straight 14-bit parallel word on DB0 to DB13, where DB13 is the MSB and the B\Y\S\H\F\ input is hardwired to a logic high. Alternatively for byte loading, the bottom eight data (See Datasheet)", 29 DB13 (in) "Parallel Data Input. The AD7835 can accept a straight 14-bit parallel word on DB0 to DB13, where DB13 is the MSB and the B\Y\S\H\F\ input is hardwired to a logic high. Alternatively for byte loading, the bottom eight data (See Datasheet)", 30 VOUT4 (out) "DAC Output.", 31 VOUT3 (out) "DAC Output.", 32 DSGB (in) "Device Sense Ground B Input. Used in conjunction with the C\L\R\ input for power-on protection of the DACs. When C\L\R\ is low, DAC outputs VOUT3 and VOUT4 are forced to the potential on the DSGB pin.", 33 NC "No Connect.", 34 NC "No Connect.", 35 VREF(-)B (in) "Reference Input for DACs 3 and 4. This reference voltage is referred to AGND.", 36 VREF(+)B (in) "Reference Input for DACs 3 and 4. This reference voltage is referred to AGND.", 37 NC "No Connect.", 38 AGND (power) "Analog Ground.", 39 VDD (power) "Positive Analog Power Supply: 15 V +/- 5% or 12 V +/- 5%.", 40 VSS (power) "Negative Analog Power Supply: -15 V +/- 5% or -12 V +/- 5%.", 41 NC "No Connect.", 42 VREF(+)A (in) "Reference Input for DAC 1 and DAC 2. This reference voltage is referred to AGND.", 43 VREF(-)A (in) "Reference Input for DAC 1 and DAC 2. This reference voltage is referred to AGND.", 44 NC "No Connect."

## AD7836ASZ
designator U?
Quad 14-Bit LC2MOS Digital-to-Analog Converter, -40 to +85 degC, S-44-2, Pb-Free, Tray; Generic Part Number: AD7836; PartNumber: AD7836ASZ; # DAC Outputs: 4; Max V+: 15.75V; Op Pwr Diss: 460mW; Resolution (Bits): 14; Settling Time: 16祍; Single Supply: No; DatasheetVersion: Rev.A; PackageVersion: 041807-A; PackageReference: S-44-2; PackageDescription: 44-Lead Metric Quad Flat Package [MQFP]; Supplier Part Number 1: AD7836ASZ-ND; Supplier Part Number 2: 59K5626; Supplier Part Number 3: 584-AD7836ASZ; Packing: Tray; RoHS: Y; Mounting Technology: Surface Mount; Code_JEDEC: MO-122-AA-1; ComponentLink1Description: Manufacturer URL; ComponentLink2Description: Datasheet; ComponentLink3Description: Package Specification; ComponentLink4Description: Product URL
footprint LQFP44_0.8mm (Footprint not found)
pins: 1 DUTGND A (in) "Device Sense Ground for DAC A. Vout A is referenced to the voltage applied to this pin.", 2 VREF(+)B (in) "Reference Inputs for DAC B. These reference voltages are referred to AGND.", 3 VREF(-)B (in) "Reference Inputs for DAC B. These reference voltages are referred to AGND.", 4 VOUTB (out) "DAC Output.", 5 DUTGND B (in) "Device Sense Ground for DAC B. Vout B is referenced to the voltage applied to this pin.", 6 A2 (in) "Address input. A2 is decoded to select one of the five input latches for a data transfer.", 7 A1 (in) "Address input. A1 is decoded to select one of the five input latches for a data transfer.", 8 A0 (in) "Address input. A0 is decoded to select one of the five input latches for a data transfer.", 9 SEL (in) "Select pin, active high level triggered input. When the SEL input is high, the user programmed value in DATAREG E will be loaded into all DAC registers and the DAC outputs updated accordingly. The contents of the other DATA (See Datasheet)", 10 ~{CS} (in) "Level-Triggered Chip Select Input (active low). The device is selected when this input is low.", 11 ~{WR} (in) "Level-Triggered Write Input (active low), when active and used in conjunction with CS to write data to the AD7836 input buffer. Data is latched into the selected data register on the rising edge of W\R\.", 12 ~{CLR} (in) "Asynchronous Clear Input (level sensitive, active low). When this input is low, all analog outputs are switched to the externally set potential on the DUTGND pin. The contents of data registers A to E are not affected when (See Datasheet)", 13 VCC (power) "Logic Power Supply; +5 V +/- 5%.", 14 DGND (power) "Digital Ground.", 15 DB0 (in) "Parallel Data Input. DB0 is the LSB.", 16 DB1 (in) "Parallel Data Input.", 17 DB2 (in) "Parallel Data Input.", 18 DB3 (in) "Parallel Data Input.", 19 DB4 (in) "Parallel Data Input.", 20 DB5 (in) "Parallel Data Input.", 21 DB6 (in) "Parallel Data Input.", 22 DB7 (in) "Parallel Data Input.", 23 DB8 (in) "Parallel Data Input.", 24 DB9 (in) "Parallel Data Input.", 25 DB10 (in) "Parallel Data Input.", 26 DB11 (in) "Parallel Data Input.", 27 DB12 (in) "Parallel Data Input.", 28 DB13 (in) "Parallel Data Input. DB13 is the MSB.", 29 DUTGND D (in) "Device Sense Ground for DAC D. Vout D is referenced to the voltage applied to this pin.", 30 VOUTD (out) "DAC Output.", 31 VREF(-)D (in) "Reference Inputs for DAC D. These reference voltages are referred to AGND.", 32 VREF(+)D (in) "Reference Inputs for DAC D. These reference voltages are referred to AGND.", 33 DUTGND C (in) "Device Sense Ground for DAC C. Vout C is referenced to the voltage applied to this pin.", 34 VOUTC (out) "DAC Output.", 35 VREF(-)C (in) "Reference Inputs for DAC C. These reference voltages are referred to AGND.", 36 VREF(+)C (in) "Reference Inputs for DAC C. These reference voltages are referred to AGND.", 37 AGND (power) "Analog Ground.", 38 NC "NO CONNECT", 39 VDD (power) "Positive Analog Power Supply; +15 V +/- 5%.", 40 NC "NO CONNECT", 41 VSS (power) "Negative Analog Power Supply; -15 V +/- 5%.", 42 VREF(+)A (in) "Reference Inputs for DAC A. These reference voltages are referred to AGND.", 43 VREF(-)A (in) "Reference Inputs for DAC A. These reference voltages are referred to AGND.", 44 VOUTA (out) "DAC Output."

## AD7837AN
designator U?
Dual 12-Bit LC2MOS Complete MDAC, -40 to +85 degC, N-24-1, Tube; Generic Part Number: AD7837; PartNumber: AD7837AN; # DAC Outputs: 2; Max V+: 15.75V; Op Pwr Diss: 210mW; Resolution (Bits): 12; Settling Time: 4祍; Single Supply: No; DatasheetVersion: C01007a-0-8/00 (rev. C); PackageVersion: 071006-A; PackageReference: N-24-1; PackageDescription: 24-Lead Plastic Dual In-Line Package [PDIP] Narrow Body; Supplier Part Number 1: AD7837AN-ND; Supplier Part Number 2: 584-AD7837AN; Packing: Tube; RoHS: N; Mounting Technology: Through Hole; Code_JEDEC: MS-001; ComponentLink1Description: Manufacturer URL; ComponentLink2Description: Datasheet; ComponentLink3Description: Package Specification; ComponentLink4Description: Product URL
footprint DIP24 (Footprint not found)
pins: 1 ~{CS} (in) "Chip Select. Active low logic input. The device is selected when this input is active.", 2 RFBA (in) "Amplifier Feedback Resistor for DAC A.", 3 VREFA (in) "Reference Input Voltage for DAC A. This may be an ac or dc signal.", 4 VOUTA (out) "Analog Output Voltage from DAC A.", 5 AGNDA (power) "Analog Ground for DAC A.", 6 VDD (power) "Positive Power Supply.", 7 VSS (power) "Negative Power Supply.", 8 AGNDB (power) "Analog Ground for DAC B.", 9 VOUTB (out) "Analog Output Voltage from DAC B.", 10 VREFB (in) "Reference Input Voltage for DAC B. This may be an ac or dc signal.", 11 DGND (power) "Digital Ground. Ground reference for digital circuitry.", 12 RFBB (in) "Amplifier Feedback Resistor for DAC B.", 13 ~{WR} (in) "Write Input. W\R\ is an active low logic input which is used in conjunction with C\S\, A0 and A1 to write data to the input latches.", 14 ~{LDAC} (in) "DAC Update Logic Input. Data is transferred from the input latches to the DAC latches when L\D\A\C\ is taken low.", 15 A1 (in) "Address Input. Most significant address input for input latches (see Table II).", 16 A0 (in) "Address Input. Least significant address input for input latches (see Table II).", 17 DB7 (in) "Data Bit 7.", 18 DB6 (in) "Data Bit 6.", 19 DB5 (in) "Data Bit 5.", 20 DB4 (in) "Data Bit 4.", 21 DB3 (in) "Data Bit 3 or Data Bit 11 (MSB)", 22 DB2 (in) "Data Bit 2 or Data Bit 10", 23 DB1 (in) "Data Bit 1 or Data Bit 9", 24 DB0 (in) "Data Bit 0 (LSB) or Data Bit 8"

## AD7837AQ
designator U?
Dual 12-Bit LC2MOS Complete MDAC, -40 to +85 degC, Q-24, Tube; Generic Part Number: AD7837; PartNumber: AD7837AQ; # DAC Outputs: 2; Max V+: 15.75V; Op Pwr Diss: 210mW; Resolution (Bits): 12; Settling Time: 4祍; Single Supply: No; DatasheetVersion: C01007a-0-8/00 (rev. C); PackageVersion: 2000; PackageReference: Q-24; PackageDescription: 24-Lead Ceramic Dual In-Line Package [CERDIP]; Supplier Part Number 1: AD7837AQ-ND; Supplier Part Number 2: 584-AD7837AQ; Packing: Tube; RoHS: N; Mounting Technology: Through Hole; ComponentLink1Description: Manufacturer URL; ComponentLink2Description: Datasheet; ComponentLink3Description: Package Specification; ComponentLink4Description: Product URL
footprint DIP24 (Footprint not found)
pins: 1 ~{CS} (in) "Chip Select. Active low logic input. The device is selected when this input is active.", 2 RFBA (in) "Amplifier Feedback Resistor for DAC A.", 3 VREFA (in) "Reference Input Voltage for DAC A. This may be an ac or dc signal.", 4 VOUTA (out) "Analog Output Voltage from DAC A.", 5 AGNDA (power) "Analog Ground for DAC A.", 6 VDD (power) "Positive Power Supply.", 7 VSS (power) "Negative Power Supply.", 8 AGNDB (power) "Analog Ground for DAC B.", 9 VOUTB (out) "Analog Output Voltage from DAC B.", 10 VREFB (in) "Reference Input Voltage for DAC B. This may be an ac or dc signal.", 11 DGND (power) "Digital Ground. Ground reference for digital circuitry.", 12 RFBB (in) "Amplifier Feedback Resistor for DAC B.", 13 ~{WR} (in) "Write Input. W\R\ is an active low logic input which is used in conjunction with C\S\, A0 and A1 to write data to the input latches.", 14 ~{LDAC} (in) "DAC Update Logic Input. Data is transferred from the input latches to the DAC latches when L\D\A\C\ is taken low.", 15 A1 (in) "Address Input. Most significant address input for input latches (see Table II).", 16 A0 (in) "Address Input. Least significant address input for input latches (see Table II).", 17 DB7 (in) "Data Bit 7.", 18 DB6 (in) "Data Bit 6.", 19 DB5 (in) "Data Bit 5.", 20 DB4 (in) "Data Bit 4.", 21 DB3 (in) "Data Bit 3 or Data Bit 11 (MSB)", 22 DB2 (in) "Data Bit 2 or Data Bit 10", 23 DB1 (in) "Data Bit 1 or Data Bit 9", 24 DB0 (in) "Data Bit 0 (LSB) or Data Bit 8"

## AD7837AR
designator U?
Dual 12-Bit LC2MOS Complete MDAC, -40 to +85 degC, RW-24, Tube; Generic Part Number: AD7837; PartNumber: AD7837AR; # DAC Outputs: 2; Max V+: 15.75V; Op Pwr Diss: 210mW; Resolution (Bits): 12; Settling Time: 4祍; Single Supply: No; DatasheetVersion: C01007a-0-8/00 (rev. C); PackageVersion: 060706-A; PackageReference: RW-24; PackageDescription: 24-Lead Standard Small Outline Package [SOIC_W]; Supplier Part Number 1: AD7837AR-ND; Supplier Part Number 2: 584-AD7837AR; Packing: Tube; RoHS: N; Mounting Technology: Surface Mount; Code_JEDEC: MS-013-AD; ComponentLink1Description: Manufacturer URL; ComponentLink2Description: Datasheet; ComponentLink3Description: Package Specification; ComponentLink4Description: Product URL
footprint SOIC24W_1.27 (Footprint not found)
pins: 1 ~{CS} (in) "Chip Select. Active low logic input. The device is selected when this input is active.", 2 RFBA (in) "Amplifier Feedback Resistor for DAC A.", 3 VREFA (in) "Reference Input Voltage for DAC A. This may be an ac or dc signal.", 4 VOUTA (out) "Analog Output Voltage from DAC A.", 5 AGNDA (power) "Analog Ground for DAC A.", 6 VDD (power) "Positive Power Supply.", 7 VSS (power) "Negative Power Supply.", 8 AGNDB (power) "Analog Ground for DAC B.", 9 VOUTB (out) "Analog Output Voltage from DAC B.", 10 VREFB (in) "Reference Input Voltage for DAC B. This may be an ac or dc signal.", 11 DGND (power) "Digital Ground. Ground reference for digital circuitry.", 12 RFBB (in) "Amplifier Feedback Resistor for DAC B.", 13 ~{WR} (in) "Write Input. W\R\ is an active low logic input which is used in conjunction with C\S\, A0 and A1 to write data to the input latches.", 14 ~{LDAC} (in) "DAC Update Logic Input. Data is transferred from the input latches to the DAC latches when L\D\A\C\ is taken low.", 15 A1 (in) "Address Input. Most significant address input for input latches (see Table II).", 16 A0 (in) "Address Input. Least significant address input for input latches (see Table II).", 17 DB7 (in) "Data Bit 7.", 18 DB6 (in) "Data Bit 6.", 19 DB5 (in) "Data Bit 5.", 20 DB4 (in) "Data Bit 4.", 21 DB3 (in) "Data Bit 3 or Data Bit 11 (MSB)", 22 DB2 (in) "Data Bit 2 or Data Bit 10", 23 DB1 (in) "Data Bit 1 or Data Bit 9", 24 DB0 (in) "Data Bit 0 (LSB) or Data Bit 8"